# Altium footprint library thu vien thong.PcbLib: 106 footprints (part 2 of 7)
Each footprint in its own frame and in the unit in brackets; x right, y up, seen from the top. Pads: shape width x height; smd on the part's side, far side on the other; paste and mask are expansions set on the pad; w line width, h text height; cw(c..) or ccw(c..) is an arc to the next point about the centre after c.
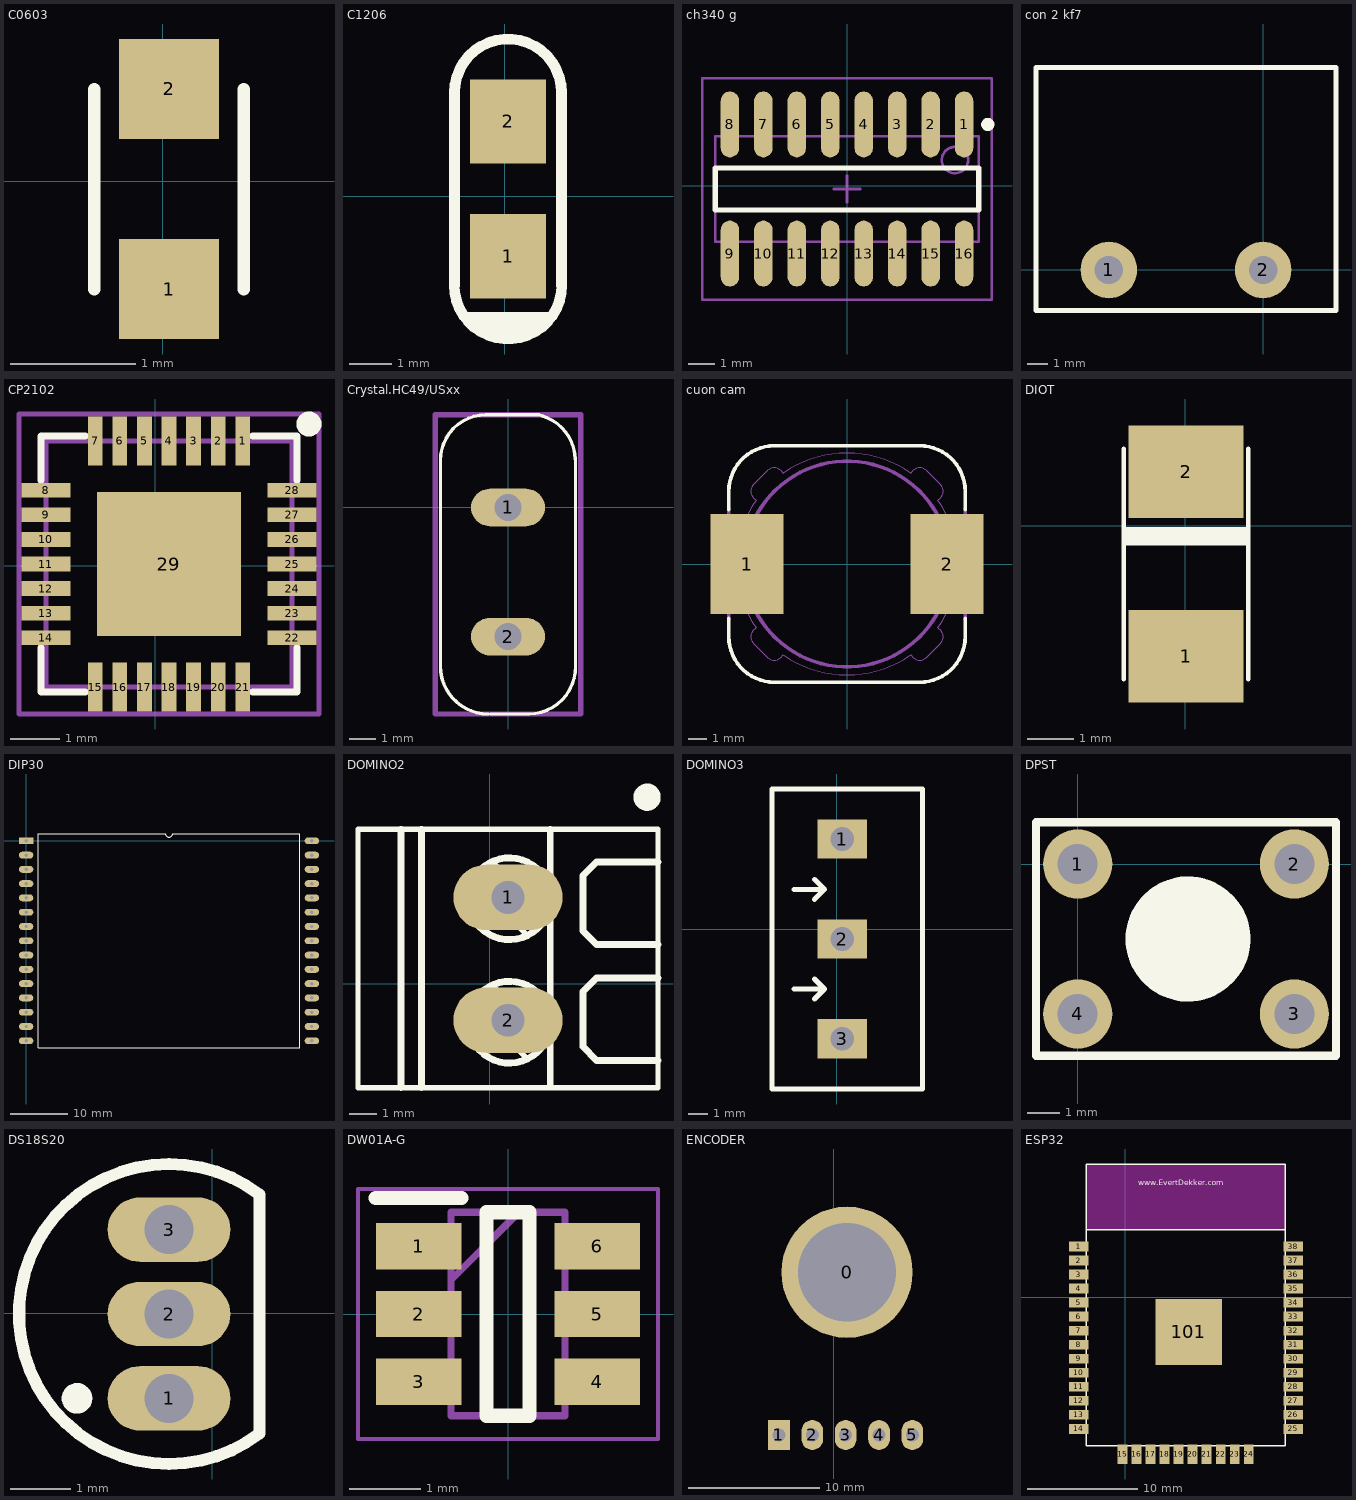
[diagram p1: the footprints below, top view; thin cyan lines are the x and y axes]

## C0603 [mm]
pads (2):
  rect 0.8x0.8 smd: 1(0.051,-0.864) 2(0.051,0.736)
Top Overlay:
  lines w0.1: -0.549,-0.864 -0.549,0.736 ; 0.651,-0.864 0.651,0.736
3D body "0603 SMD Capacitor.STEP": height 0.3, standoff 0, extent -0.349,-0.864 0.451,0.736

## C1206 [mm]
pads (2):
  rect 1.8x2 smd: 1(0.076,-1.422) 2(0.076,1.778)
Top Overlay:
  lines w0.254: -1.2,-2.108 ccw(c0.076,-2.108) 1.353,-2.108 ; -1.194,-2.108 -1.194,2.464 cw(c0.076,2.464) 1.346,2.464 1.346,-2.108 ; -0.94,-2.87 1.092,-2.87 ; -0.813,-2.997 0.965,-2.997 ; -0.686,-3.124 0.838,-3.124 ; -0.432,-3.251 0.584,-3.251
3D body "User Library-cap_a.step": height 1.61, standoff 0, extent -0.724,-1.418 0.876,1.773

## ch340 g [mm]
pads (16):
  oval 0.7x2.5 smd: 1(4.445,2.323) 2(3.175,2.323) 3(1.905,2.323) 4(0.635,2.323) 5(-0.635,2.323) 6(-1.905,2.323) 7(-3.175,2.323) 8(-4.445,2.323) 9(-4.445,-2.577) 10(-3.175,-2.577) 11(-1.905,-2.577) 12(-0.635,-2.577) 13(0.635,-2.577) 14(1.905,-2.577) 15(3.175,-2.577) 16(4.445,-2.577)
Top Overlay:
  circle w0.25: c5.345,2.323 r0.125
  lines w0.2: -5,-0.927 5,-0.927 5,0.673 -5,0.673 -5,-0.927
Mechanical 13:
  circle w0.1: c4.1,0.973 r0.5
  lines w0.1: -5,-2.127 5,-2.127 5,1.873 -5,1.873 -5,-2.127
Mechanical 15:
  lines w0.1: -0.5,-0.127 0.5,-0.127 ; 0,-0.627 0,0.373 ; -5.5,-4.327 5.5,-4.327 5.5,4.073 -5.5,4.073 -5.5,-4.327
3D body "User Library-SOP-16.step": height 1.45, standoff 0, extent -5.004,-3.086 4.978,2.819

## con 2 kf7 [mil]
pads (2):
  round 110 hole 55.12: 1(-300,0) 2(0,0)
Top Overlay:
  lines w10: -441.73,-78.74 -441.73,121.06 -441.73,393.7 141.73,393.7 141.73,121.06 141.73,-78.74 ; -438.98,-78.74 -419.09,-78.74 84.84,-78.74 140.75,-78.74

## CP2102 [mm]
pads (29):
  rect 0.3x1 smd: 1(1.779,2.534) 2(1.279,2.534) 3(0.779,2.534) 4(0.279,2.534) 5(-0.221,2.534) 6(-0.721,2.534) 7(-1.221,2.534) 15(-1.221,-2.466) 16(-0.721,-2.466) 17(-0.221,-2.466) 18(0.279,-2.466) 19(0.779,-2.466) 20(1.279,-2.466) 21(1.779,-2.466)
  rect 1x0.3 smd: 8(-2.221,1.534) 9(-2.221,1.034) 10(-2.221,0.534) 11(-2.221,0.034) 12(-2.221,-0.466) 13(-2.221,-0.966) 14(-2.221,-1.466) 22(2.779,-1.466) 23(2.779,-0.966) 24(2.779,-0.466) 25(2.779,0.034) 26(2.779,0.534) 27(2.779,1.034) 28(2.779,1.534)
  rect 2.921x2.921 smd paste-3.2: 29(0.279,0.034)
Top Overlay:
  circle w0.254: c3.123,2.878 r0.127
  lines w0.15: -2.321,-1.666 -2.321,-2.566 -1.421,-2.566 ; -2.321,1.734 -2.321,2.634 -1.421,2.634 ; 1.979,-2.566 2.879,-2.566 2.879,-1.666 ; 1.979,2.634 2.879,2.634 ; 2.879,1.734 2.879,2.625
Top Paste:
  region: -0.102,-1.49 0.66,-1.49 0.66,-0.728 -0.102,-0.728
  region: -0.102,0.796 0.66,0.796 0.66,1.558 -0.102,1.558
  region: -0.102,-0.347 0.66,-0.347 0.66,0.415 -0.102,0.415
  region: -1.245,-1.49 -0.483,-1.49 -0.483,-0.728 -1.245,-0.728
  region: -1.245,-0.347 -0.483,-0.347 -0.483,0.415 -1.245,0.415
  region: -1.245,1.558 -1.245,0.796 -0.483,0.796 -0.483,1.558
  region: 1.041,1.558 1.041,0.796 1.803,0.796 1.803,1.558
  region: 1.803,0.415 1.041,0.415 1.041,-0.347 1.803,-0.347
  region: 1.803,-0.728 1.041,-0.728 1.041,-1.49 1.803,-1.49
Mechanical 13:
  lines w0.1: -2.221,-2.466 2.779,-2.466 2.779,2.534 -2.221,2.534 -2.221,-2.466
Mechanical 15:
  lines w0.1: -0.221,0.034 0.779,0.034 ; 0.279,-0.466 0.279,0.534 ; -2.769,-3.014 -2.769,3.082 3.327,3.082 3.327,-3.014 -2.769,-3.014
3D body "User Library-QFN-28-0_5.STEP": height 1, standoff 0, extent -2.22,-2.466 2.78,2.534

## Crystal.HC49/USxx [mil] "HC49USxx package"
height 200
pads (2):
  rrect100% 110x56 hole 40: 1(0,0) 2(0,-192)
Top Overlay:
  lines w5: -100.39,69.88 cw(c-32.97,70.37) -33.46,137.8 46.26,137.8 ; -100.39,70.21 -100.39,-236.22 ccw(c-29.53,-236.22) -29.53,-307.09 ; -25.59,-307.09 31.5,-307.09 ccw(c30.51,-237.2) 100.39,-236.22 100.39,70.36 ; 50.38,136.26 cw(c31.28,70.36) 99.87,71.55
Mechanical 13:
  lines w7.87: -108.27,-307.09 -108.27,137.8 108.27,137.8 108.27,-307.09 -108.27,-307.09
3D body: height 200, standoff 0, extent -10,-10.2 10,9.8
3D body: height 200, standoff 0, extent -10,-202.2 10,-182.2
3D body: height 31.5, standoff 5, extent -89.85,-297.5 90.15,127.5
3D body: height 140, standoff 7.87, extent -71.85,-280.51 72.83,110.48

## cuon cam [mm]
pads (2):
  rect 4x5.5 smd: 1(-5.5,0) 2(5.5,0)
Top Overlay:
  lines w0.203: -6.5,-3 -6.5,-4 ccw(c-4,-4) -4,-6.5 4,-6.5 ccw(c4,-4) 6.5,-4 6.5,-3 ; -6.5,3 -6.5,4 cw(c-4,4) -4,6.5 4,6.5 cw(c4,4) 6.5,4 6.5,3
Mechanical 1:
  circle w0.203: c0,0 r5.657
  lines w0.051: -5.146,-4.354 cw(c-4.793,-4) -5.146,-3.646 -5,-3.5 cw(c0,0) -5,3.501 -5.146,3.646 cw(c-4.793,4) -5.146,4.354 -4.354,5.146 cw(c-4,4.793) -3.646,5.146 -3.5,5 cw(c0,0) 3.501,5 3.646,5.146 cw(c4,4.793) 4.354,5.146 5.146,4.354 cw(c4.793,4) 5.146,3.646 5,3.5 cw(c0,0) 5,-3.501 5.146,-3.646 cw(c4.793,-4) 5.146,-4.354 4.354,-5.146 cw(c4,-4.793) 3.646,-5.146 3.5,-5 cw(c0,0) -3.501,-5 -3.646,-5.146 cw(c-4,-4.793) -4.354,-5.146 -5.146,-4.354
  lines w0.203: -6.5,-3 -6.5,3 ; 6.5,-3 6.5,3

## DIOT [mm]
pads (2):
  rect 2.5x2 smd: 1(0.019,-2.824) 2(0.019,1.176)
Top Overlay:
  region: 1.42,-0.424 1.42,-0.024 -1.28,-0.024 -1.28,-0.424
  lines w0.1: -1.331,-3.324 -1.331,1.676 ; 1.369,-3.324 1.369,1.676
3D body "SW3DPS-DIOD SMD 10BF10-DEFAULT.STEP": height 2.45, standoff 0.02, extent -1.781,-3.474 1.819,1.826

## DIP30 [mm]
pads (30):
  rect 2.5x1.2 hole 0.6: 1(0,0)
  oval 2.5x1.2 hole 0.6: 2(0,-2.5) 3(0,-5) 4(0,-7.5) 5(0,-10) 6(0,-12.5) 7(0,-15) 8(0,-17.5) 9(0,-20) 10(0,-22.5) 11(0,-25) 12(0,-27.5) 13(0,-30) 14(0,-32.5) 15(0,-35) 16(50,-35) 17(50,-32.5) 18(50,-30) 19(50,-27.5) 20(50,-25) 21(50,-22.5) 22(50,-20) 23(50,-17.5) 24(50,-15) 25(50,-12.5) 26(50,-10) 27(50,-7.5) 28(50,-5) 29(50,-2.5) 30(50,0)
Top Overlay:
  lines w0.2: 2.085,-36.25 2.085,1.25 24.375,1.25 ccw(c25,1.25) 25.625,1.25 47.915,1.25 47.915,-36.25 2.085,-36.25

## DOMINO2 [mm]
pads (2):
  oval 4x2.4 hole 1.2: 1(0.674,3.165) 2(0.674,-1.335)
Top Overlay:
  circle w0.5: c5.774,6.84 r0.25
  circle w0.254: c0.724,-1.41 r1.5
  circle w0.254: c0.724,3.115 r1.5
  lines w0.2: -0.626,-0.735 1.374,-2.735 ; -0.626,3.79 1.374,1.79 ; 0.086,-0.048 2.087,-2.048 ; 0.086,4.477 2.087,2.477 ; -4.826,-3.81 -4.826,5.665 6.174,5.665 6.174,-3.81 -4.826,-3.81
  lines w0.254: -3.251,-3.81 -3.251,5.665 ; -2.501,-3.81 -2.501,5.665 ; 2.224,-3.785 2.224,5.665 ; 6.174,-2.81 3.924,-2.81 3.424,-2.31 3.424,-0.285 3.924,0.215 6.174,0.215 ; 6.174,1.44 3.924,1.44 3.424,1.94 3.424,3.965 3.924,4.465 6.174,4.465
3D body: height 4.5, standoff 0.01, extent -4.826,-3.81 6.174,5.665
3D body: height 8.5, standoff 4.5, extent -2.026,-2.835 2.674,4.665
3D body: height 2.5, standoff -1, extent 0.149,2.615 1.249,3.715
3D body: height 2.5, standoff -1, extent 0.149,-1.91 1.249,-0.81
3D body: height 3.5, standoff 1, extent 4.44,2.381 5.424,3.891
3D body: height 3.5, standoff 1, extent 4.44,-1.969 5.424,-0.459
3D body: height 8.55, standoff 7.6, extent -0.426,2.14 1.824,4.19
3D body: height 8.6, standoff 7.6, extent -0.322,2.24 0.578,4.09
3D body: height 8.6, standoff 7.6, extent 0.828,2.248 1.728,4.098
3D body: height 8.6, standoff 7.6, extent 0.828,-2.277 1.728,-0.427
3D body: height 8.6, standoff 7.6, extent -0.322,-2.285 0.578,-0.435
3D body: height 8.55, standoff 7.6, extent -0.426,-2.385 1.824,-0.335

## DOMINO3 [mm]
pads (3):
  rect 2.5x2 hole 1.2: 1(0.28,4.595) 2(0.28,-0.485) 3(0.28,-5.552)
Top Overlay:
  lines w0.254: -2.184,-3.025 -0.622,-3.025 ; -2.184,2.042 -0.622,2.042 ; -1.13,-3.533 -0.622,-3.025 ; -1.13,-2.517 -0.622,-3.025 ; -1.13,1.534 -0.622,2.042 ; -1.13,2.55 -0.622,2.042 ; -3.301,-8.105 -3.301,7.135 4.344,7.135 4.344,-8.105 -3.301,-8.105
3D body "SW3DPS-HDR1x3-MED-GREEN.STEP": height 10, standoff -4, extent -3.225,-7.985 4.275,7.015

## DPST [mil] "Double-Pole, Single-Throw Switch; 4 Leads; Solder Pad 35mil"
pads (4):
  round 83 hole 48: 1(0,0) 2(260,0) 3(260,-180) 4(0,-180)
Top Overlay:
  circle w80: c132.5,-90 r35
  lines w10: -50,-230 310,-230 310,50 -50,50 -50,-230
3D body "SW3dPS-diptronics tactile dts-63k.STEP": height 275.59, standoff -137.8, extent -25.51,-212.04 285.52,32.06

## DS18S20 [mil]
pads (3):
  oval 80x42 hole 32: 1(-28.11,-55.63) 2(-28.11,-0.63) 3(-28.11,54.37)
Top Overlay:
  circle w10: c-88.11,-55.63 r5
  lines w7.87: 30.95,-78.58 cw(c-28.11,-0.63) 30.95,77.32 30.94,-78.58
3D body "User Library-TO-92A.step": height 214.96, standoff -218.11, extent -121.6,-95.11 33.13,93.87

## DW01A-G [mm]
pads (6):
  rect 1.2x0.65 smd: 1(-1.25,0.95) 2(-1.25,0) 3(-1.25,-0.95) 4(1.25,-0.95) 5(1.25,0) 6(1.25,0.95)
Top Overlay:
  lines w0.2: -1.85,1.625 -0.65,1.625 ; -0.3,-1.425 -0.3,1.425 0.3,1.425 0.3,-1.425 -0.3,-1.425
Mechanical 13:
  lines w0.1: -0.8,0.475 0.15,1.425 ; -0.8,-1.425 -0.8,1.425 0.8,1.425 0.8,-1.425 -0.8,-1.425
Mechanical 15:
  lines w0.05: -2.1,-1.75 -2.1,1.75 2.1,1.75 2.1,-1.75 -2.1,-1.75
3D body "DW01A-G.stp": height 1.35, standoff 0, extent -1.4,-1.425 1.4,1.425

## ENCODER [mil]
pads (6):
  round 393.7 hole 295.28: 0(39,1553)
  rect 65x90 hole 39.37: 1(-165,1065)
  oval 65x90 hole 39.37: 2(-65,1065) 3(35,1065) 4(135,1065) 5(235,1065)
Bottom Overlay:
  circle w12: c39,1553 r215.01
  circle w12: c-161,1203 r50
  circle w12: c39,1203 r50
  circle w12: c239,1203 r50
  lines w12: -218.25,1354.71 cw(c39,1553) 294.57,1352.55 ; -216,1352 -34,1352 ; -210,1753 -42,1753 ; 120,1351 294,1351 ; 125,1751 293,1751 ; 294,1348 339,1303 339,978 -261,978 -261,1308 ; -261,1308 -216,1353 -261,1308
3D body "SW3dPS-omeg pot.STEP": height 866.14, standoff -407.48, extent -353.15,812.92 450,2007.08

## ESP32 [mm]
pads (39):
  rect 1.778x0.9 smd: 1(-4.201,4.569) 2(-4.201,3.299) 3(-4.201,2.029) 4(-4.201,0.759) 5(-4.201,-0.511) 6(-4.201,-1.781) 7(-4.201,-3.051) 8(-4.201,-4.321) 9(-4.201,-5.591) 10(-4.201,-6.861) 11(-4.201,-8.131) 12(-4.201,-9.401) 13(-4.201,-10.671) 14(-4.201,-11.941) 25(15.256,-11.941) 26(15.256,-10.671) 27(15.256,-9.401) 28(15.256,-8.131) 29(15.256,-6.861) 30(15.256,-5.591) 31(15.256,-4.321) 32(15.256,-3.051) 33(15.256,-1.781) 34(15.256,-0.511) 35(15.256,0.759) 36(15.256,2.029) 37(15.256,3.299) 38(15.256,4.569)
  rect 0.9x1.778 smd: 15(-0.215,-14.244) 16(1.055,-14.244) 17(2.325,-14.244) 18(3.595,-14.244) 19(4.865,-14.244) 20(6.135,-14.244) 21(7.405,-14.244) 22(8.675,-14.244) 23(9.945,-14.244) 24(11.215,-14.244)
  rect 6x6 smd: 101(5.785,-3.165)
Top Overlay:
  lines w0.127: -3.515,6.093 14.519,6.093 ; -3.515,-13.465 14.519,-13.465 14.519,12.062 -3.515,12.062 -3.515,-13.465
  text "www.EvertDekker.com" at 1.184,10.157 h0.5
Keep-Out Layer:
  rectangle: -3.515,6.093 14.519,12.062
3D body: height 2, standoff 0.8, extent -2.88,-12.83 14.011,6.093
3D body: height 0.8, standoff 0, extent -3.515,-13.465 14.519,12.062